# Altium footprint library misc.PcbLib: 60 footprints (part 1 of 4)
Each footprint in its own frame and in the unit in brackets; x right, y up, seen from the top. Pads: shape width x height; smd on the part's side, far side on the other; paste and mask are expansions set on the pad; w line width, h text height; cw(c..) or ccw(c..) is an arc to the next point about the centre after c.
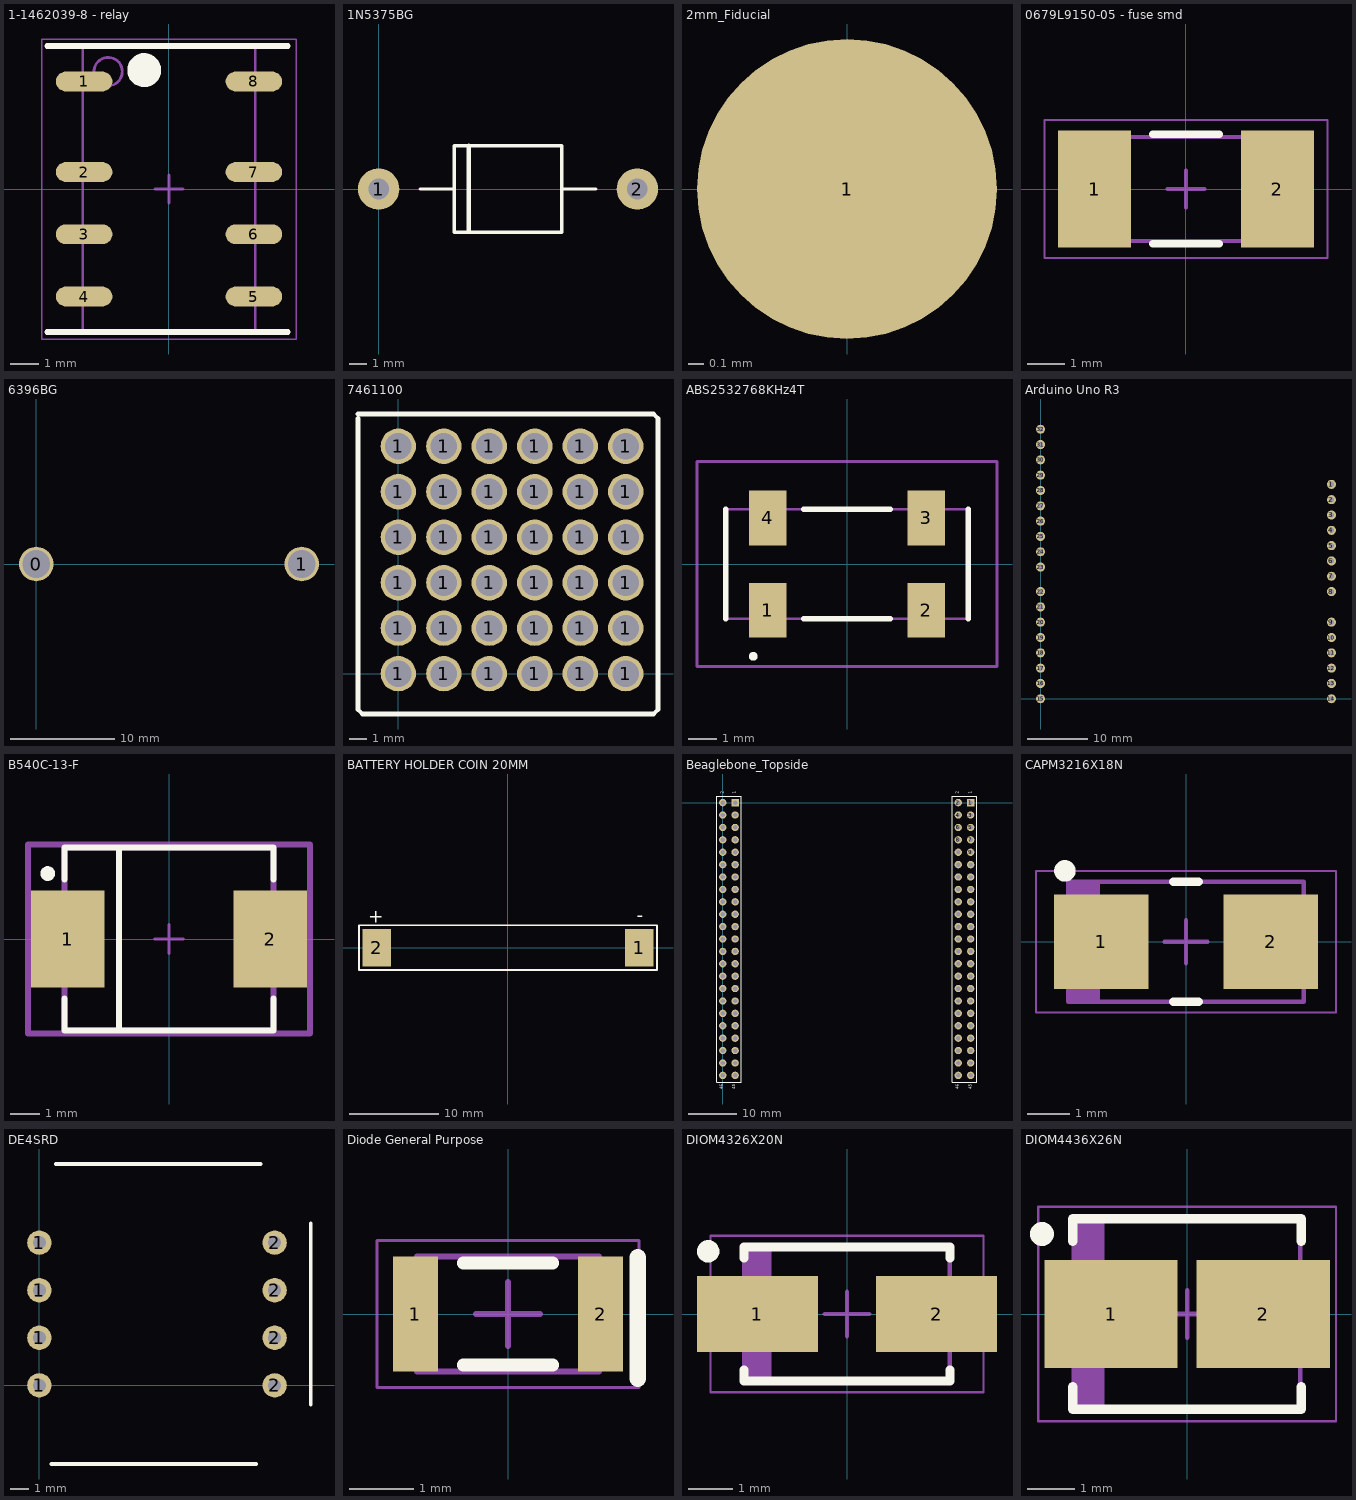
[diagram p0: the footprints below, top view; thin cyan lines are the x and y axes]

## 1-1462039-8 - relay [mm] "SOIC, 8-Leads, Body 10.00x6.00mm, Pitch 1.27mm, IPC Medium Density"
height 5.65
pads (8):
  oval 2x0.7 smd: 1(-3,3.8) 2(-3,0.6) 3(-3,-1.6) 4(-3,-3.8) 5(3,-3.8) 6(3,-1.6) 7(3,0.6) 8(3,3.8)
Top Overlay:
  circle w0.6: c-0.875,4.2 r0.3
  lines w0.2: -4.3,-5.05 4.2,-5.05 ; -4.3,5.05 4.2,5.05
Top Assembly:
  circle w0.1: c-2.15,4.15 r0.5
  lines w0.1: -3.05,-5.05 3.05,-5.05 3.05,5.05 -3.05,5.05 -3.05,-5.05
Mechanical 15:
  lines w0.05: -4.5,-5.3 4.5,-5.3 4.5,5.3 -4.5,5.3 -4.5,-5.3
  lines w0.1: -0.5,0 0.5,0 ; 0,-0.5 0,0.5
3D body: height 5.65, standoff 0.2, extent -3.05,-5.05 3.05,5.05

## 1N5375BG [mm]
pads (2):
  round 2.4 hole 1.2: 1(0,0) 2(15,0)
Top Overlay:
  lines w0.2: 2.4,0 4.375,0 ; 10.625,0 12.6,0 ; 4.375,0 4.375,-2.5 10.625,-2.5 10.625,2.5 4.375,2.5 4.375,0
  lines w0.254: 5.225,-2.475 5.225,2.5

## 2mm_Fiducial [mm]
pads (1):
  round 2 smd: 1(0,0)

## 0679L9150-05 - fuse smd [mm] "Chip Diode, 2-Leads, Body 6.10x2.54mm, IPC Medium Density"
height 2.79
pads (2):
  rect 1.96x3.15 smd: 1(-2.455,0) 2(2.455,0)
Top Overlay:
  lines w0.2: -0.9,-1.475 0.9,-1.475 ; -0.9,1.475 0.9,1.475
Top Assembly:
  lines w0.1: -3.175,-1.395 -3.175,1.395 3.175,1.395 3.175,-1.395 -3.175,-1.395
Top Courtyard:
  lines w0.05: -3.8,-1.85 -3.8,1.85 3.8,1.85 3.8,-1.85 -3.8,-1.85
  lines w0.1: -0.5,0 0.5,0 ; 0,-0.5 0,0.5
3D body: height 2.79, standoff 0, extent -1.675,-1.395 1.675,1.395
3D body: height 2.79, standoff 0, extent -3.175,-1.395 -1.675,1.395
3D body: height 2.79, standoff 0, extent 1.675,-1.395 3.175,1.395

## 6396BG [mil] "Heat Sink TO-220, TO-218 Aluminum 4.0W @ 30°C Board Level, Vertical"
pads (2):
  round 130 hole 105: 0(0,0) 1(1000,0)
3D body "6396BG_1--3DModel-STEP-418109.STEP": height 1000, standoff -155.91, extent -325,-504.61 1325,495.39

## 7461100 [mm]
pads (36):
  round 1.975 / inner round 1.6 / far side round 1.975 hole 1.475: 1(0,0) 1(0,2.54) 1(0,5.08) 1(0,7.62) 1(0,10.16) 1(0,12.7) 1(2.54,0) 1(2.54,2.54) 1(2.54,5.08) 1(2.54,7.62) 1(2.54,10.16) 1(2.54,12.7) 1(5.08,0) 1(5.08,2.54) 1(5.08,5.08) 1(5.08,7.62) 1(5.08,10.16) 1(5.08,12.7) 1(7.62,0) 1(7.62,2.54) 1(7.62,5.08) 1(7.62,7.62) 1(7.62,10.16) 1(7.62,12.7) 1(10.16,0) 1(10.16,2.54) 1(10.16,5.08) 1(10.16,7.62) 1(10.16,10.16) 1(10.16,12.7) 1(12.7,0) 1(12.7,2.54) 1(12.7,5.08) 1(12.7,7.62) 1(12.7,10.16) 1(12.7,12.7)
Top Overlay:
  lines w0.254: -2.25,14.25 -2.25,-2 -2,-2.25 14.25,-2.25 14.5,-2 14.5,14.25 14.25,14.5 -2.25,14.5
3D body "7461100 (rev1).stp": height 24, standoff -3.5, extent -1.75,-1.75 14.25,14.25

## ABS2532768KHz4T [mm]
pads (4):
  rect 1.3x1.9 smd: 1(-2.75,-1.6) 2(2.75,-1.6) 3(2.75,1.6) 4(-2.75,1.6)
Top Overlay:
  lines w0.2: -4.2,-1.9 -4.2,1.9 ; -1.5,-1.9 1.5,-1.9 ; -1.5,1.9 1.5,1.9 ; 4.2,-1.9 4.2,1.9 ; -3.3,-3.2 ccw(c-3.25,-3.2) -3.2,-3.2 ccw(c-3.25,-3.2) -3.3,-3.2
Mechanical 13:
  lines w0.1: -4.2,-1.9 -4.2,1.9 4.2,1.9 4.2,-1.9 -4.2,-1.9
Mechanical 15:
  lines w0.1: -5.2,-3.55 -5.2,3.55 5.2,3.55 5.2,-3.55 -5.2,-3.55
3D body "ABS25-32.768KHz-4-T.stp": height 2.7, standoff 0, extent -4.2,-2.42 4.2,2.42

## Arduino Uno R3 [mm]
pads (32):
  round 1.5 hole 0.9: 1(48.26,35.56) 2(48.26,33.02) 3(48.26,30.48) 4(48.26,27.94) 5(48.26,25.4) 6(48.26,22.86) 7(48.26,20.32) 8(48.26,17.78) 9(48.26,12.7) 10(48.26,10.16) 11(48.26,7.62) 12(48.26,5.08) 13(48.26,2.54) 14(48.26,0) 15(0,0) 16(0,2.54) 17(0,5.08) 18(0,7.62) 19(0,10.16) 20(0,12.7) 21(0,15.24) 22(0,17.78) 23(0,21.844) 24(0,24.384) 25(0,26.924) 26(0,29.464) 27(0,32.004) 28(0,34.544) 29(0,37.084) 30(0,39.624) 31(0,42.164) 32(0,44.704)
3D body "arduino uno.STEP": height 13.09, standoff -2.16, extent -2.413,-5.08 50.927,69.85

## B540C-13-F [mm]
pads (2):
  rect 2.5x3.3 smd paste+0 mask+0: 1(-3.45,0) 2(3.45,0)
Top Overlay:
  circle w0.25: c-4.125,2.225 r0.125
  lines w0.2: -3.555,-2.025 -3.555,-3.11 3.555,-3.11 3.555,-2.025 ; -3.555,2.025 -3.555,3.11 3.555,3.11 3.555,2.025 ; -1.7,-3 -1.7,3
Mechanical 10:
  lines w0.2: -4.8,-3.21 4.8,-3.21 4.8,3.21 -4.8,3.21 -4.8,-3.21
  text ".Designator" at 0,0 h1
Mechanical 12:
  lines w0.2: -3.555,-3.11 3.555,-3.11 3.555,3.11 -3.555,3.11 -3.555,-3.11
Mechanical 15:
  lines w0.1: -0.5,0 0.5,0 ; 0,-0.5 0,0.5
  lines w0.2: -4.8,-3.21 4.8,-3.21 4.8,3.21 -4.8,3.21 -4.8,-3.21
3D body "Diode_Diodes_Inc._B540C-13-F_eec.STEP": height 0.25, standoff 0, extent -4.8,-3.21 4.8,3.21

## BATTERY HOLDER COIN 20MM [mm]
pads (2):
  rect 3.2x4.2 smd: 1(14.65,0) 2(-14.65,0)
Top Overlay:
  lines w0.2: -16.65,-2.5 16.65,-2.5 16.65,2.5 -16.65,2.5 -16.65,0 -16.65,-2.5
  text "-" at 14.351,2.921 h1.52
  text "+" at -15.621,2.794 h1.52
3D body "BU2032SM-JJ-GTR.STEP": height 5.3, standoff 0, extent -15.723,-10.475 15.977,9.525

## Beaglebone_Topside [mm] "Connector; Header; 24x2 Position"
pads (92):
  rect 1.5x1.5 hole 0.9: 1(50.8,0) 101(2.54,0)
  round 1.5 hole 0.9: 2(48.26,0) 3(50.8,-2.54) 4(48.26,-2.54) 5(50.8,-5.08) 6(48.26,-5.08) 7(50.8,-7.62) 8(48.26,-7.62) 9(50.8,-10.16) 10(48.26,-10.16) 11(50.8,-12.7) 12(48.26,-12.7) 13(50.8,-15.24) 14(48.26,-15.24) 15(50.8,-17.78) 16(48.26,-17.78) 17(50.8,-20.32) 18(48.26,-20.32) 19(50.8,-22.86) 20(48.26,-22.86) 21(50.8,-25.4) 22(48.26,-25.4) 23(50.8,-27.94) 24(48.26,-27.94) 25(50.8,-30.48) 26(48.26,-30.48) 27(50.8,-33.02) 28(48.26,-33.02) 29(50.8,-35.56) 30(48.26,-35.56) 31(50.8,-38.1) 32(48.26,-38.1) 33(50.8,-40.64) 34(48.26,-40.64) 35(50.8,-43.18) 36(48.26,-43.18) 37(50.8,-45.72) 38(48.26,-45.72) 39(50.8,-48.26) 40(48.26,-48.26) 41(50.8,-50.8) 42(48.26,-50.8) 43(50.8,-53.34) 44(48.26,-53.34) 45(50.8,-55.88) 46(48.26,-55.88) 102(0,0) 103(2.54,-2.54) 104(0,-2.54) 105(2.54,-5.08) 106(0,-5.08) 107(2.54,-7.62) 108(0,-7.62) 109(2.54,-10.16) 110(0,-10.16) 111(2.54,-12.7) 112(0,-12.7) 113(2.54,-15.24) 114(0,-15.24) 115(2.54,-17.78) 116(0,-17.78) 117(2.54,-20.32) 118(0,-20.32) 119(2.54,-22.86) 120(0,-22.86) 121(2.54,-25.4) 122(0,-25.4) 123(2.54,-27.94) 124(0,-27.94) 125(2.54,-30.48) 126(0,-30.48) 127(2.54,-33.02) 128(0,-33.02) 129(2.54,-35.56) 130(0,-35.56) 131(2.54,-38.1) 132(0,-38.1) 133(2.54,-40.64) 134(0,-40.64) 135(2.54,-43.18) 136(0,-43.18) 137(2.54,-45.72) 138(0,-45.72) 139(2.54,-48.26) 140(0,-48.26) 141(2.54,-50.8) 142(0,-50.8) 143(2.54,-53.34) 144(0,-53.34) 145(2.54,-55.88) 146(0,-55.88)
Top Overlay:
  lines w0.2: -1.27,-57.277 3.81,-57.277 3.81,1.27 -1.27,1.27 -1.27,-57.277 ; 46.99,-57.277 46.99,1.27 52.07,1.27 52.07,-57.277 46.99,-57.277
  text "2" at 48.514,1.778 h1.02
  text "1" at 51.181,1.778 h1.02
  text "46" at 48.514,-58.674 h1.02
  text "45" at 51.181,-58.674 h1.02
  text "45" at 2.794,-58.674 h1.02
  text "46" at 0.254,-58.674 h1.02
  text "1" at 2.921,1.778 h1.02
  text "2" at 0.381,1.778 h1.02
3D body "BeagleBone Black.SLDPRT": height 15.24, standoff 0.63, extent -1.821,-66.548 52.789,22.352

## CAPM3216X18N [mm]
height 2.3
pads (2):
  rect 2.2x2.21 smd: 1(-1.975,0) 2(1.975,0)
Top Overlay:
  circle w0.25: c-2.825,1.655 r0.125
  lines w0.2: -0.3,-1.4 0.3,-1.4 ; -0.3,1.4 0.3,1.4
Top Assembly:
  rectangle: -2.75,-1.4 -2.01,1.4
  lines w0.1: -2.75,-1.4 2.75,-1.4 2.75,1.4 -2.75,1.4 -2.75,-1.4
Top Courtyard:
  lines w0.05: -3.5,-1.65 3.5,-1.65 3.5,1.65 -3.5,1.65 -3.5,-1.65
  lines w0.1: -0.5,0 0.5,0 ; 0,-0.5 0,0.5
3D body "CAPM3216X18N.step": height 2.3, standoff 0, extent -2.97,-1.4 2.97,1.4

## DE4SRD [mm]
pads (8):
  round 1.3 hole 0.7: 1(0,0) 1(0,2.54) 1(0,5.08) 1(0,7.62) 2(12.55,0) 2(12.55,2.54) 2(12.55,5.08) 2(12.55,7.62)
Top Overlay:
  lines w0.2: 0.635,-4.191 11.557,-4.191 ; 0.889,11.811 11.811,11.811 ; 14.478,-1.016 14.478,8.636
3D body "DE-4.STEP": height 10.6, standoff -4.6, extent -1.2,-3.7 13.8,11.3

## Diode General Purpose [mm] "Chip Diode, 2-Leads, Body 2.70x1.60mm, IPC Medium Density"
height 1.35
pads (2):
  rect 0.7x1.8 smd: 1(-1.45,0) 2(1.45,0)
Top Overlay:
  lines w0.2: -0.7,-0.8 0.7,-0.8 ; -0.7,0.8 0.7,0.8
  lines w0.254: 2.032,-1.016 2.032,0.889
Mechanical 13:
  lines w0.1: -1.425,-0.9 -1.425,0.9 1.425,0.9 1.425,-0.9 -1.425,-0.9
Mechanical 15:
  lines w0.05: -2.05,-1.15 -2.05,1.15 2.05,1.15 2.05,-1.15 -2.05,-1.15
  lines w0.1: -0.5,0 0.5,0 ; 0,-0.5 0,0.5
3D body: height 1.35, standoff 0, extent -1.275,-0.9 1.275,0.9
3D body: height 1.35, standoff 0, extent -1.425,-0.9 -1.275,0.9
3D body: height 1.35, standoff 0, extent 1.275,-0.9 1.425,0.9

## DIOM4326X20N [mm] "Molded Diode, 2-Leads, Body 4.30x2.61mm, IPC Medium Density"
height 1.96
pads (2):
  rect 2.7x1.7 smd: 1(-2,0) 2(2,0)
Top Overlay:
  circle w0.25: c-3.1,1.4 r0.125
  lines w0.2: -2.3,-1.25 -2.3,-1.5 2.3,-1.5 2.3,-1.25 ; -2.3,1.25 -2.3,1.5 2.3,1.5 2.3,1.25
Mechanical 13:
  rectangle: -2.3,-1.46 -1.681,1.46
  lines w0.1: -2.3,-1.46 -2.3,1.46 2.3,1.46 2.3,-1.46 -2.3,-1.46
Mechanical 15:
  lines w0.05: -3.05,-1.75 -3.05,1.75 3.05,1.75 3.05,-1.75 -3.05,-1.75
  lines w0.1: -0.5,0 0.5,0 ; 0,-0.5 0,0.5
3D body "DIOM4326X20N.step": height 1.96, standoff 0, extent -2.52,-1.46 2.52,1.46

## DIOM4436X26N [mm] "Molded Diode, 2-Leads, Body 4.40x3.62mm, IPC Medium Density"
height 2.61
pads (2):
  rect 2.8x2.26 smd: 1(-1.6,0) 2(1.6,0)
Top Overlay:
  circle w0.25: c-3.05,1.68 r0.125
  lines w0.2: -2.4,-1.53 -2.4,-2 2.4,-2 2.4,-1.53 ; -2.4,1.53 -2.4,2 2.4,2 2.4,1.53
Mechanical 13:
  rectangle: -2.375,-1.97 -1.736,1.97
  lines w0.1: -2.375,-1.97 2.375,-1.97 2.375,1.97 -2.375,1.97 -2.375,-1.97
Mechanical 15:
  lines w0.05: -3.125,-2.25 3.125,-2.25 3.125,2.25 -3.125,2.25 -3.125,-2.25
  lines w0.1: -0.5,0 0.5,0 ; 0,-0.5 0,0.5
3D body "DIOM4436X26N.step": height 2.61, standoff 0, extent -2.595,-1.97 2.595,1.97